# Altium footprint library CPU_STM.PcbLib: 216 footprints (part 13 of 15)
Each footprint in its own frame and in the unit in brackets; x right, y up, seen from the top. Pads: shape width x height; smd on the part's side, far side on the other; paste and mask are expansions set on the pad; w line width, h text height; cw(c..) or ccw(c..) is an arc to the next point about the centre after c.
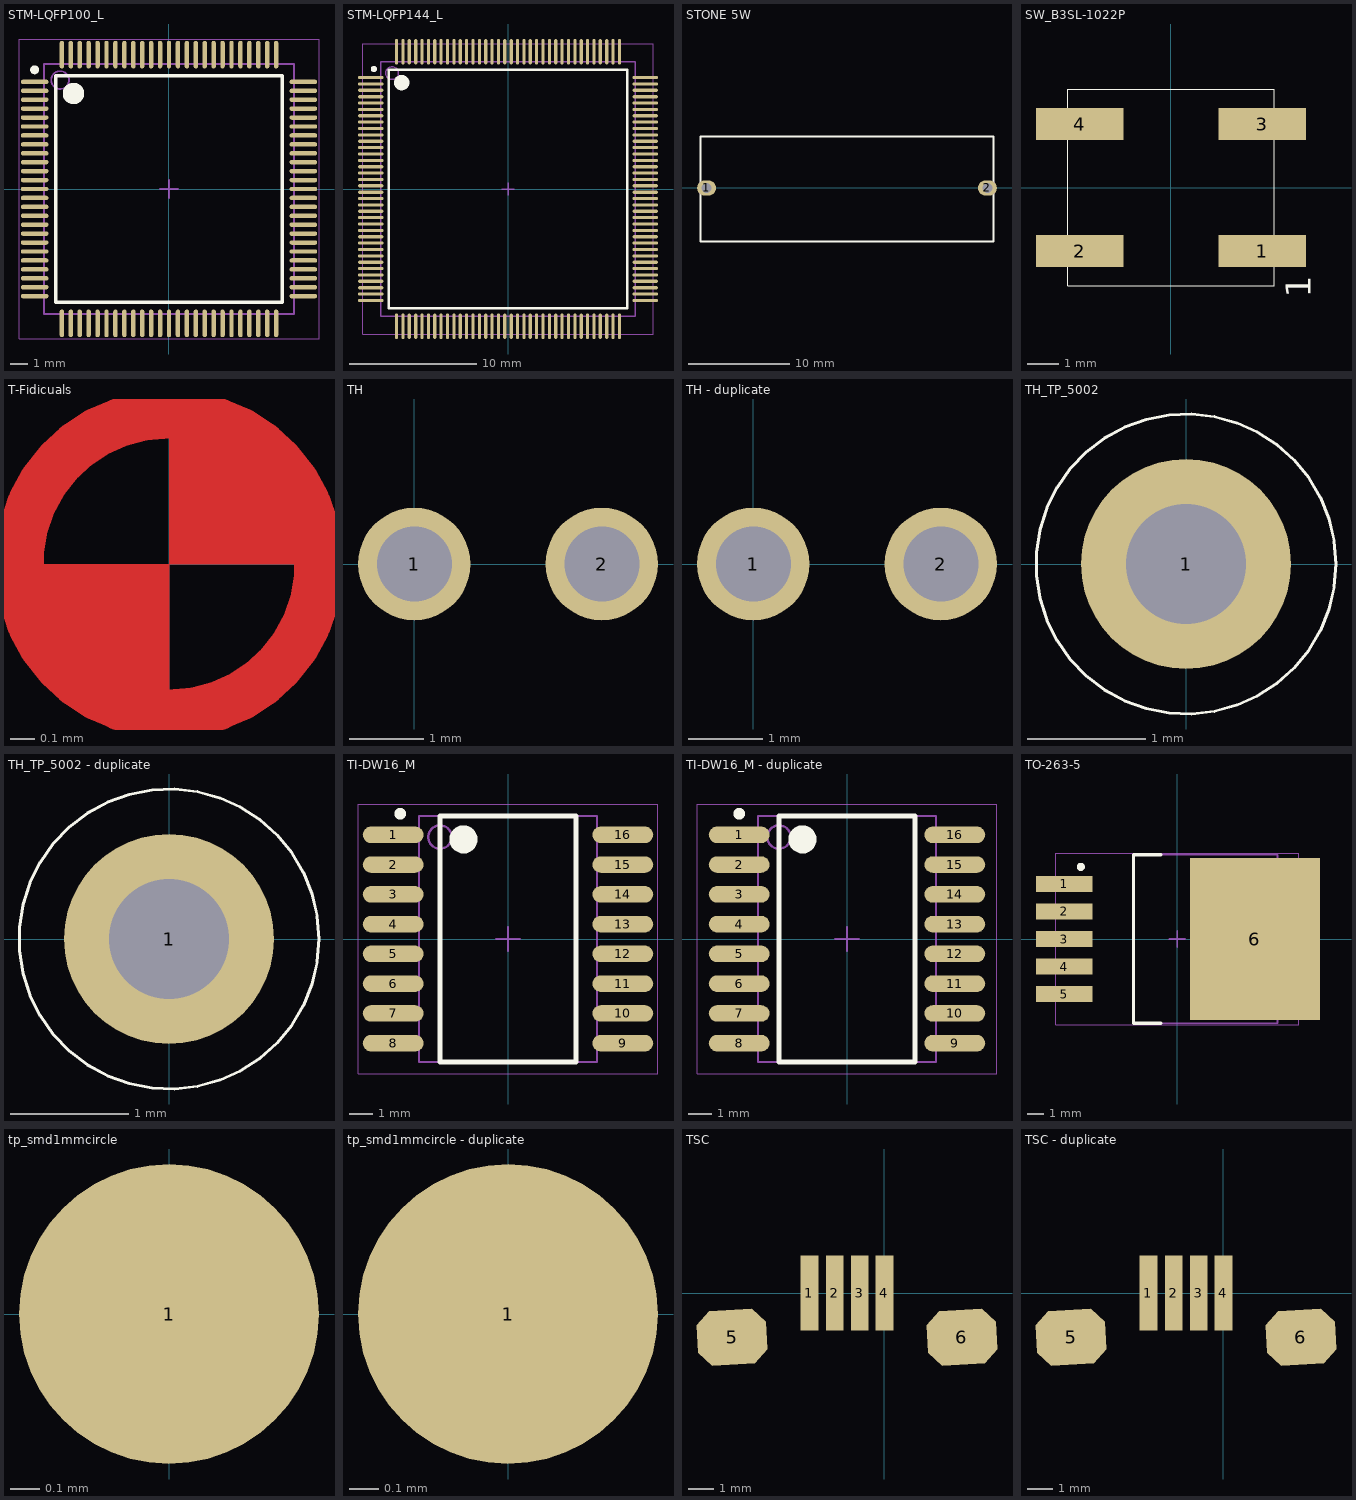
[diagram p12: the footprints below, top view; thin cyan lines are the x and y axes]

## STM-LQFP100_L [mm] "Thin QFP, 100-Leads, Body 14x14mm, Pitch 0.5mm, IPC High Density"
height 1.6
pads (100):
  oval 1.55x0.25 smd: 1(-7.525,6) 2(-7.525,5.5) 3(-7.525,5) 4(-7.525,4.5) 5(-7.525,4) 6(-7.525,3.5) 7(-7.525,3) 8(-7.525,2.5) 9(-7.525,2) 10(-7.525,1.5) 11(-7.525,1) 12(-7.525,0.5) 13(-7.525,0) 14(-7.525,-0.5) 15(-7.525,-1) 16(-7.525,-1.5) 17(-7.525,-2) 18(-7.525,-2.5) 19(-7.525,-3) 20(-7.525,-3.5) 21(-7.525,-4) 22(-7.525,-4.5) 23(-7.525,-5) 24(-7.525,-5.5) 25(-7.525,-6) 51(7.525,-6) 52(7.525,-5.5) 53(7.525,-5) 54(7.525,-4.5) 55(7.525,-4) 56(7.525,-3.5) 57(7.525,-3) 58(7.525,-2.5) 59(7.525,-2) 60(7.525,-1.5) 61(7.525,-1) 62(7.525,-0.5) 63(7.525,0) 64(7.525,0.5) 65(7.525,1) 66(7.525,1.5) 67(7.525,2) 68(7.525,2.5) 69(7.525,3) 70(7.525,3.5) 71(7.525,4) 72(7.525,4.5) 73(7.525,5) 74(7.525,5.5) 75(7.525,6)
  oval 0.25x1.55 smd: 26(-6,-7.525) 27(-5.5,-7.525) 28(-5,-7.525) 29(-4.5,-7.525) 30(-4,-7.525) 31(-3.5,-7.525) 32(-3,-7.525) 33(-2.5,-7.525) 34(-2,-7.525) 35(-1.5,-7.525) 36(-1,-7.525) 37(-0.5,-7.525) 38(0,-7.525) 39(0.5,-7.525) 40(1,-7.525) 41(1.5,-7.525) 42(2,-7.525) 43(2.5,-7.525) 44(3,-7.525) 45(3.5,-7.525) 46(4,-7.525) 47(4.5,-7.525) 48(5,-7.525) 49(5.5,-7.525) 50(6,-7.525) 76(6,7.525) 77(5.5,7.525) 78(5,7.525) 79(4.5,7.525) 80(4,7.525) 81(3.5,7.525) 82(3,7.525) 83(2.5,7.525) 84(2,7.525) 85(1.5,7.525) 86(1,7.525) 87(0.5,7.525) 88(0,7.525) 89(-0.5,7.525) 90(-1,7.525) 91(-1.5,7.525) 92(-2,7.525) 93(-2.5,7.525) 94(-3,7.525) 95(-3.5,7.525) 96(-4,7.525) 97(-4.5,7.525) 98(-5,7.525) 99(-5.5,7.525) 100(-6,7.525)
Top Overlay:
  circle w0.6: c-5.35,5.35 r0.3
  circle w0.25: c-7.525,6.675 r0.125
  lines w0.2: -6.35,-6.35 6.35,-6.35 6.35,6.35 -6.35,6.35 -6.35,-6.35
Mechanical 13:
  circle w0.1: c-6.1,6.1 r0.5
  lines w0.1: -7,-7 7,-7 7,7 -7,7 -7,-7
Mechanical 15:
  lines w0.05: -8.4,-8.4 8.4,-8.4 8.4,8.4 -8.4,8.4 -8.4,-8.4
  lines w0.1: -0.5,0 0.5,0 ; 0,-0.5 0,0.5
3D body: height 1.6, standoff 0.05, extent -7,-7 7,7

## STM-LQFP144_L [mm]
pads (144):
  oval 2x0.25 smd mask+0.2: 1(-10.779,8.75) 2(-10.779,8.25) 3(-10.779,7.75) 4(-10.779,7.25) 5(-10.779,6.75) 6(-10.779,6.25) 7(-10.779,5.75) 8(-10.779,5.25) 9(-10.779,4.75) 10(-10.779,4.25) 11(-10.779,3.75) 12(-10.779,3.25) 13(-10.779,2.75) 14(-10.779,2.25) 15(-10.779,1.75) 16(-10.779,1.25) 17(-10.779,0.75) 18(-10.779,0.25) 19(-10.779,-0.25) 20(-10.779,-0.75) 21(-10.779,-1.25) 22(-10.779,-1.75) 23(-10.779,-2.25) 24(-10.779,-2.75) 25(-10.779,-3.25) 26(-10.779,-3.75) 27(-10.779,-4.25) 28(-10.779,-4.75) 29(-10.779,-5.25) 30(-10.779,-5.75) 31(-10.779,-6.25) 32(-10.779,-6.75) 33(-10.779,-7.25) 34(-10.779,-7.75) 35(-10.779,-8.25) 36(-10.779,-8.75) 73(10.779,-8.75) 74(10.779,-8.25) 75(10.779,-7.75) 76(10.779,-7.25) 77(10.779,-6.75) 78(10.779,-6.25) 79(10.779,-5.75) 80(10.779,-5.25) 81(10.779,-4.75) 82(10.779,-4.25) 83(10.779,-3.75) 84(10.779,-3.25) 85(10.779,-2.75) 86(10.779,-2.25) 87(10.779,-1.75) 88(10.779,-1.25) 89(10.779,-0.75) 90(10.779,-0.25) 91(10.779,0.25) 92(10.779,0.75) 93(10.779,1.25) 94(10.779,1.75) 95(10.779,2.25) 96(10.779,2.75) 97(10.779,3.25) 98(10.779,3.75) 99(10.779,4.25) 100(10.779,4.75) 101(10.779,5.25) 102(10.779,5.75) 103(10.779,6.25) 104(10.779,6.75) 105(10.779,7.25) 106(10.779,7.75) 107(10.779,8.25) 108(10.779,8.75)
  oval 0.25x2 smd mask+0.2: 37(-8.75,-10.779) 38(-8.25,-10.779) 39(-7.75,-10.779) 40(-7.25,-10.779) 41(-6.75,-10.779) 42(-6.25,-10.779) 43(-5.75,-10.779) 44(-5.25,-10.779) 45(-4.75,-10.779) 46(-4.25,-10.779) 47(-3.75,-10.779) 48(-3.25,-10.779) 49(-2.75,-10.779) 50(-2.25,-10.779) 51(-1.75,-10.779) 52(-1.25,-10.779) 53(-0.75,-10.779) 54(-0.25,-10.779) 55(0.25,-10.779) 56(0.75,-10.779) 57(1.25,-10.779) 58(1.75,-10.779) 59(2.25,-10.779) 60(2.75,-10.779) 61(3.25,-10.779) 62(3.75,-10.779) 63(4.25,-10.779) 64(4.75,-10.779) 65(5.25,-10.779) 66(5.75,-10.779) 67(6.25,-10.779) 68(6.75,-10.779) 69(7.25,-10.779) 70(7.75,-10.779) 71(8.25,-10.779) 72(8.75,-10.779) 109(8.75,10.779) 110(8.25,10.779) 111(7.75,10.779) 112(7.25,10.779) 113(6.75,10.779) 114(6.25,10.779) 115(5.75,10.779) 116(5.25,10.779) 117(4.75,10.779) 118(4.25,10.779) 119(3.75,10.779) 120(3.25,10.779) 121(2.75,10.779) 122(2.25,10.779) 123(1.75,10.779) 124(1.25,10.779) 125(0.75,10.779) 126(0.25,10.779) 127(-0.25,10.779) 128(-0.75,10.779) 129(-1.25,10.779) 130(-1.75,10.779) 131(-2.25,10.779) 132(-2.75,10.779) 133(-3.25,10.779) 134(-3.75,10.779) 135(-4.25,10.779) 136(-4.75,10.779) 137(-5.25,10.779) 138(-5.75,10.779) 139(-6.25,10.779) 140(-6.75,10.779) 141(-7.25,10.779) 142(-7.75,10.779) 143(-8.25,10.779) 144(-8.75,10.779)
Top Overlay:
  circle w0.25: c-10.525,9.425 r0.125
  circle w0.6: c-8.35,8.35 r0.3
  lines w0.2: -9.35,-9.35 -9.35,9.35 9.35,9.35 9.35,-9.35 -9.35,-9.35
Mechanical 13:
  circle w0.1: c-9.1,9.1 r0.5
  lines w0.1: -10,-10 -10,10 10,10 10,-10 -10,-10
Mechanical 15:
  lines w0.05: -11.4,-11.4 -11.4,11.4 11.4,11.4 11.4,-11.4 -11.4,-11.4
  lines w0.1: -0.5,0 0.5,0 ; 0,-0.5 0,0.5
3D body "LQFP_144 PIN TQFP.step": height 1.7, standoff 0.05, extent -11,-11 11,11

## STONE 5W [mm]
pads (2):
  oval 1.9x1.524 hole 1: 1(4,0) 2(31.8,0)
Top Overlay:
  lines w0.2: 3.4,-5.3 32.4,-5.3 32.4,5.1 3.4,5.1 3.4,-5.3
3D body "Resistors 5W 1K1 PCB Horizontal.step": height 9, standoff -3.6, extent 3.555,-5.1 32.245,4.9

## SW_B3SL-1022P [mm] "SW_B3SL-1022P"
pads (4):
  rect 2.75x1 smd: 1(2.875,-2) 2(-2.875,-2) 3(2.875,2) 4(-2.875,2)
Top Overlay:
  lines w0.025: -3.25,-3.1 -3.25,3.1 3.25,3.1 3.25,-3.1 -3.25,-3.1
  text "1" at 4.407,-3.468 h0.79
3D body "User Library-TS-1170S-WP.step": height 7, standoff 0, extent -4.025,-3.25 3.975,3.25

## T-Fidicuals [mm] "Fidicuals"
Top Layer:
  region: 0,-0.625 -0.375,-0.5 -0.625,-0.25 -0.625,0 0,0
  region: 0.625,0 0,0 0,0.625 0.375,0.5 0.625,0.25
  lines w0.203: 0,-0.625 ccw(c0,0) 0,0.625 ccw(c0,0) 0,-0.625
Top Solder:
  circle w0.203: c0,0 r0.625
  region: 0.625,0 0.5,-0.375 0.25,-0.625 -0.25,-0.625 -0.5,-0.375 -0.625,0 -0.5,0.375 -0.375,0.5 0,0.625 0.375,0.5 0.5,0.25 0.5,0.375 0.375,0.5

## TH [mil]
pads (2):
  round 60 hole 40: 1(0,0) 2(100,0)

## TH - duplicate [mil]
pads (2):
  round 60 hole 40: 1(0,0) 2(100,0)

## TH_TP_5002 [mil] "TH_TP_5002"
pads (1):
  round 70 hole 40: 1(0,0)
Top Overlay:
  circle w1: c0,0 r50

## TH_TP_5002 - duplicate [mil] "TH_TP_5002"
pads (1):
  round 70 hole 40: 1(0,0)
Top Overlay:
  circle w1: c0,0 r50

## TI-DW16_M [mm] "SOIC, 16-Leads, Body 10.3x7.5mm, Pitch 1.27mm, IPC Low Density"
height 2.65
pads (16):
  oval 2.6x0.7 smd: 1(-4.9,4.445) 2(-4.9,3.175) 3(-4.9,1.905) 4(-4.9,0.635) 5(-4.9,-0.635) 6(-4.9,-1.905) 7(-4.9,-3.175) 8(-4.9,-4.445) 9(4.9,-4.445) 10(4.9,-3.175) 11(4.9,-1.905) 12(4.9,-0.635) 13(4.9,0.635) 14(4.9,1.905) 15(4.9,3.175) 16(4.9,4.445)
Top Overlay:
  circle w0.25: c-4.6,5.345 r0.125
  circle w0.6: c-1.9,4.25 r0.3
  lines w0.2: -2.9,-5.25 -2.9,5.25 2.9,5.25 2.9,-5.25 -2.9,-5.25
Mechanical 13:
  circle w0.1: c-2.9,4.35 r0.5
  lines w0.1: -3.8,-5.25 -3.8,5.25 3.8,5.25 3.8,-5.25 -3.8,-5.25
Mechanical 15:
  lines w0.05: -6.4,-5.75 -6.4,5.75 6.4,5.75 6.4,-5.75 -6.4,-5.75
  lines w0.1: -0.5,0 0.5,0 ; 0,-0.5 0,0.5
3D body "SOIC16_Wide_JEDEC_MS-013AA.step": height 3.22, standoff 0.58, extent -5.215,-5.25 5.415,5.25

## TI-DW16_M - duplicate [mm] "SOIC, 16-Leads, Body 10.3x7.5mm, Pitch 1.27mm, IPC Low Density"
height 2.65
pads (16):
  oval 2.6x0.7 smd: 1(-4.6,4.445) 2(-4.6,3.175) 3(-4.6,1.905) 4(-4.6,0.635) 5(-4.6,-0.635) 6(-4.6,-1.905) 7(-4.6,-3.175) 8(-4.6,-4.445) 9(4.6,-4.445) 10(4.6,-3.175) 11(4.6,-1.905) 12(4.6,-0.635) 13(4.6,0.635) 14(4.6,1.905) 15(4.6,3.175) 16(4.6,4.445)
Top Overlay:
  circle w0.6: c-1.9,4.25 r0.3
  circle w0.25: c-4.6,5.345 r0.125
  lines w0.2: -2.9,-5.25 2.9,-5.25 2.9,5.25 -2.9,5.25 -2.9,-5.25
Mechanical 13:
  circle w0.1: c-2.9,4.35 r0.5
  lines w0.1: -3.8,-5.25 3.8,-5.25 3.8,5.25 -3.8,5.25 -3.8,-5.25
Mechanical 15:
  lines w0.05: -6.4,-5.75 6.4,-5.75 6.4,5.75 -6.4,5.75 -6.4,-5.75
  lines w0.1: -0.5,0 0.5,0 ; 0,-0.5 0,0.5
3D body: height 2.65, standoff 0.1, extent -3.8,-5.25 3.8,5.25

## TO-263-5 [mm] "D2-PAK, 6-Leads, Body 8.6x10.2mm, Pitch 1.7mm, Lead Span 14.1mm, IPC High Density"
height 4.65
pads (6):
  rect 3.5x1 smd mask+0.5: 1(-6.966,3.4) 2(-6.966,1.7) 3(-6.966,0) 4(-6.966,-1.7) 5(-6.966,-3.4)
  rect 8x10 smd: 6(4.8,0)
Top Overlay:
  circle w0.25: c-5.95,4.45 r0.125
  lines w0.2: -1,-5.2 -2.7,-5.2 -2.7,5.2 -1,5.2
Mechanical 13:
  lines w0.1: -2.7,-5.2 6.19,-5.2 6.19,5.2 -2.7,5.2 -2.7,-5.2
Mechanical 15:
  lines w0.05: -7.5,-5.3 7.5,-5.3 7.5,5.3 -7.5,5.3 -7.5,-5.3
  lines w0.1: -0.5,0 0.5,0 ; 0,-0.5 0,0.5
3D body "MIC29302WU.step": height 4.7, standoff 0.15, extent -7.927,-5.15 7.301,5.15

## tp_smd1mmcircle [mil] "TP_SMD1MMCIRCLE"
pads (1):
  round 40 smd: 1(0,0)

## tp_smd1mmcircle - duplicate [mil] "TP_SMD1MMCIRCLE"
pads (1):
  round 40 smd: 1(0,0)

## TSC [mm] "CNFPC1X40-0P5MM"
pads (6):
  rect 0.7x3 smd mask+0.06: 1(-3,0) 2(-2,0) 3(-1,0) 4(0,0)
  oct 2.8x2.2 smd rot 3 mask+0.06: 5(-6.1,-1.762) 6(3.1,-1.762)

## TSC - duplicate [mm] "CNFPC1X40-0P5MM"
pads (6):
  rect 0.7x3 smd mask+0.06: 1(-3,0) 2(-2,0) 3(-1,0) 4(0,0)
  oct 2.8x2.2 smd rot 3 mask+0.06: 5(-6.1,-1.762) 6(3.1,-1.762)